# Altium footprint library custom.PcbLib: 305 footprints (part 4 of 20)
Each footprint in its own frame and in the unit in brackets; x right, y up, seen from the top. Pads: shape width x height; smd on the part's side, far side on the other; paste and mask are expansions set on the pad; w line width, h text height; cw(c..) or ccw(c..) is an arc to the next point about the centre after c.
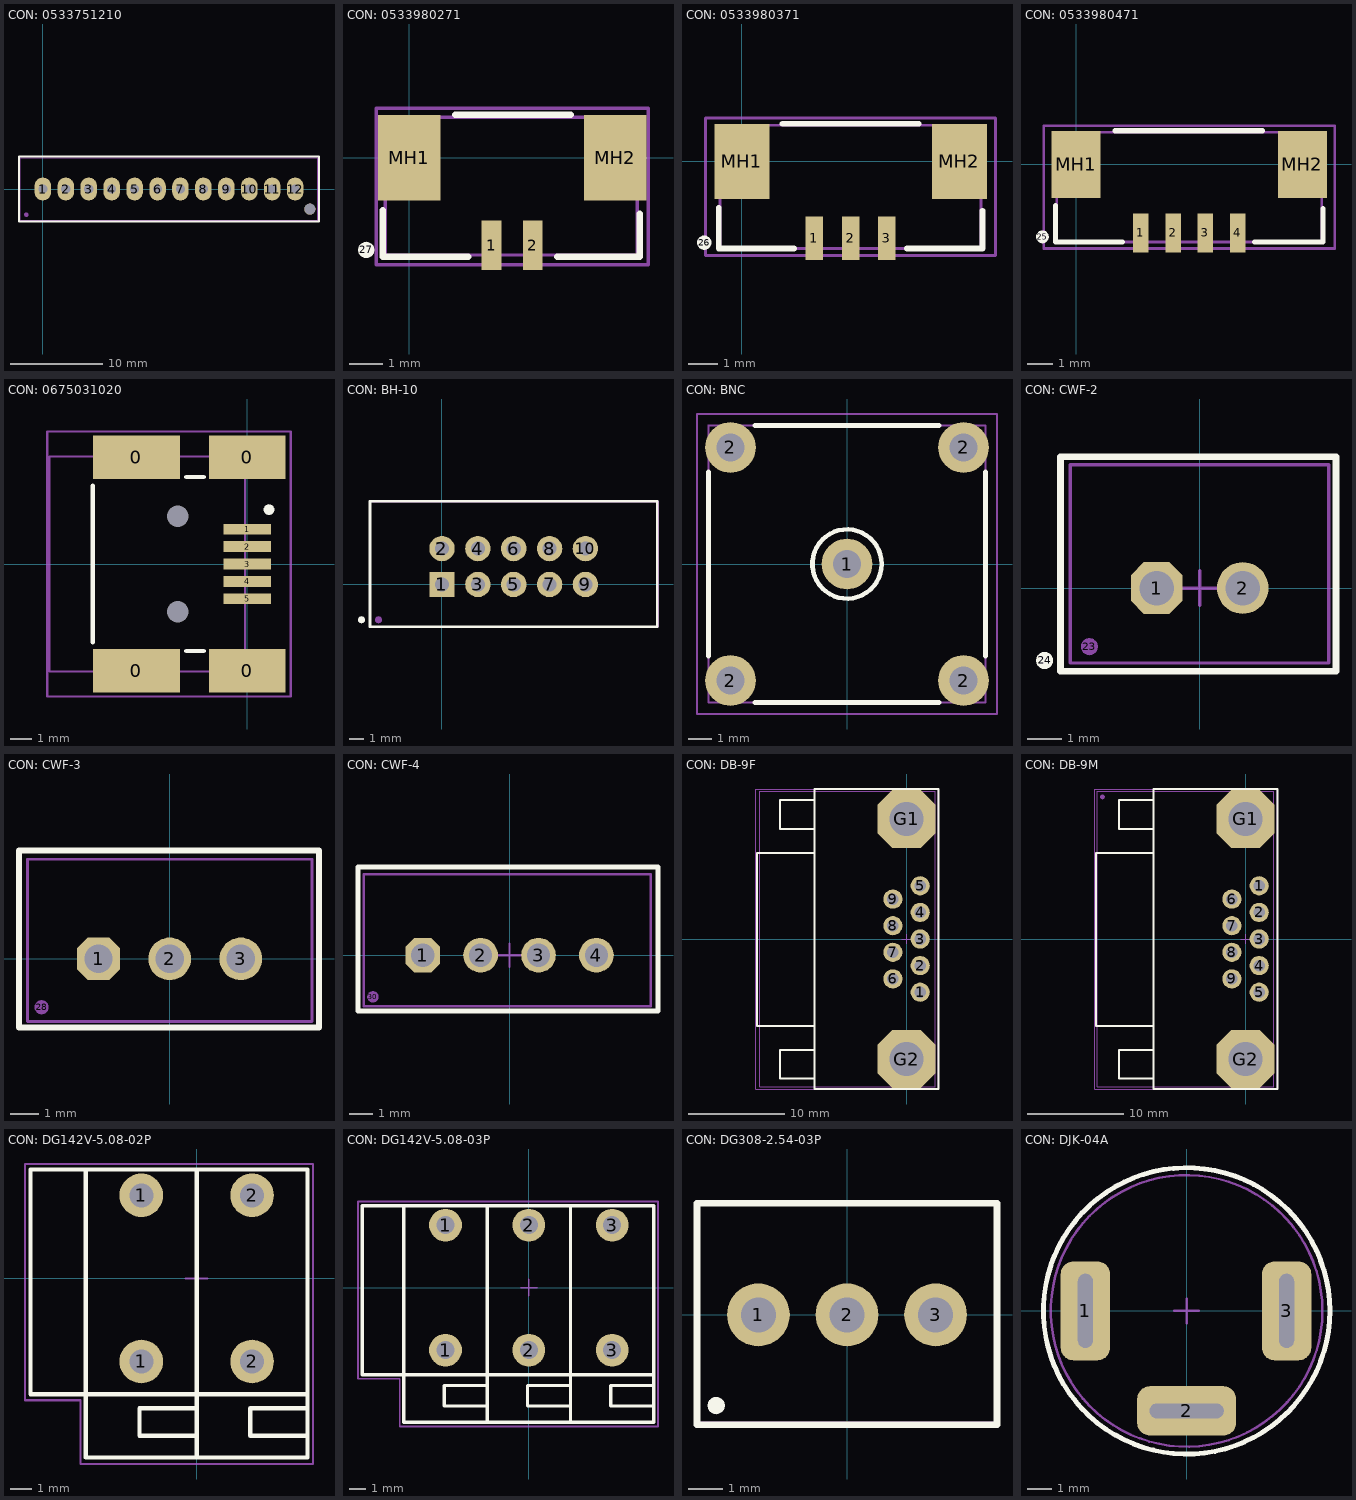
[diagram p3: the footprints below, top view; thin cyan lines are the x and y axes]

## CON: 0533751210 [mm] "MOLEX Mini-Lock"
height 11.5
pads (14):
  oval 1.8x2.5 hole 1: 1(0,0) 2(2.5,0) 3(5,0) 4(7.5,0) 5(10,0) 6(12.5,0) 7(15,0) 8(17.5,0) 9(20,0) 10(22.5,0) 11(25,0) 12(27.5,0)
  round 0.5 on Mech1: ""(-1.8,-2.8)
  round 1.2 hole 1.2: ""(29.1,-2.2)
Top Overlay:
  lines w0.254: -2.6,-3.55 30.1,-3.55 30.1,3.55 -2.6,3.55 -2.6,-3.55
Top Assy:
  lines w0.1: -2.45,-3.4 29.95,-3.4 29.95,3.4 -2.45,3.4 -2.45,-3.4
3D body "533751210.stp": height 11.55, standoff -3.38, extent -2.45,-3.4 29.95,3.4

## CON: 0533980271 [mm] "Pitch 1.25mm 2 pin Vertical SMT"
height 4.8
pads (5):
  rect 0.6x1.5 smd: 1(2.5,-2.65) 2(3.75,-2.65)
  round 0.5 on Top Overlay: 27(-1.3,-2.8)
  rect 1.9x2.6 smd: MH1(0,0) MH2(6.25,0)
Top Overlay:
  lines w0.2: -0.8,-1.6 -0.8,-3 1.8,-3 ; 1.4,1.3 4.9,1.3 ; 4.5,-3 7,-3 7,-1.7
Top Assy:
  lines w0.1: -0.725,-2.95 -0.725,-1.5 -0.725,1.225 6.925,1.225 6.925,-2.925 6.9,-2.95 -0.725,-2.95
Size Area:
  lines w0.1: -1,-3.25 -1,1.5 7.25,1.5 7.25,-3.25 -1,-3.25
3D body "533980271.stp": height 4.7, standoff 0, extent -0.725,-2.95 6.925,1.25

## CON: 0533980371 [mm] "Pitch 1.25mm 3 pin Vertical SMT"
height 4.8
pads (6):
  rect 0.6x1.5 smd: 1(2.5,-2.65) 2(3.75,-2.65) 3(5,-2.65)
  round 0.5 on Top Overlay: 26(-1.3,-2.8)
  rect 1.9x2.6 smd: MH1(0,0) MH2(7.5,0)
Top Overlay:
  lines w0.2: -0.8,-1.6 -0.8,-3 1.8,-3 ; 1.4,1.3 6.1,1.3 ; 5.7,-3 8.3,-3 8.3,-1.7
Top Assy:
  lines w0.1: -0.75,-3 -0.75,1.25 8.25,1.25 8.25,-3 -0.75,-3
Size Area:
  lines w0.1: -1.25,-3.25 -1.25,1.5 8.75,1.5 8.75,-3.25 -1.25,-3.25
3D body "533980371.stp": height 4.7, standoff 0, extent -0.7,-2.95 8.2,1.25

## CON: 0533980471 [mm]
pads (7):
  rect 0.6x1.5 smd: 1(2.5,-2.65) 2(3.75,-2.65) 3(5,-2.65) 4(6.25,-2.65)
  round 0.5 on Top Overlay: 25(-1.3,-2.8)
  rect 1.9x2.6 smd: MH1(0,0) MH2(8.75,0)
Top Overlay:
  lines w0.2: -0.8,-1.6 -0.8,-3 1.8,-3 ; 1.5,1.3 7.2,1.3 ; 6.9,-3 9.55,-3 9.55,-1.7
Top Assy:
  lines w0.1: -0.75,-3 -0.75,1.25 9.5,1.25 9.5,-3 -0.75,-3
Size Area:
  lines w0.1: -1.25,-3.25 -1.25,1.5 10,1.5 10,-3.25 -1.25,-3.25
3D body "533980471.stp": height 4.7, standoff 0, extent -0.7,-2.925 9.45,1.275

## CON: 0675031020 [mm]
pads (13):
  rect 4x2 smd: 0(-5.1,-4.9) 0(-5.1,4.9)
  rect 3.5x2 smd: 0(0,-4.9) 0(0,4.9)
  rect 2.2x0.5 smd: 1(0,1.6) 2(0,0.8) 3(0,0) 4(0,-0.8) 5(0,-1.6)
  round 0 hole 1: ""(-3.2,-2.2) ""(-3.2,2.2)
  round 0.5 on Mech1: ""(-0.6,4.5)
  round 0.5 on Top Overlay: ""(1,2.5)
Top Overlay:
  lines w0.2: -7.1,-3.6 -7.1,3.6 ; -2.8,-4 -2,-4 ; -2.8,4 -2,4
Top Assy:
  lines w0.1: -9.1,-4.95 -0.1,-4.95 -0.1,4.95 -9.1,4.95 -9.1,-4.95
Size Area:
  lines w0.1: -9.2,-6.1 2,-6.1 2,6.1 -9.2,6.1 -9.2,-6.1
3D body "675031020.stp": height 3.95, standoff -1, extent -9.1,-4.95 -0.1,4.95

## CON: BH-10 [mm] "Connector; Header; 10 Position"
pads (12):
  rect 1.8x1.8 hole 1: 1(0,0)
  round 1.8 hole 1: 2(0,2.54) 3(2.54,0) 4(2.54,2.54) 5(5.08,0) 6(5.08,2.54) 7(7.62,0) 8(7.62,2.54) 9(10.16,0) 10(10.16,2.54)
  round 0.5 on Top Overlay: ""(-5.7,-2.5)
  round 0.5 on Mech1: ""(-4.5,-2.5)
Top Overlay:
  lines w0.2: -5.1,-3 15.25,-3 15.25,5.9 -5.1,5.9 -5.1,-3
Top Assy:
  lines w0.1: -5.07,-2.98 -5.07,5.87 15.23,5.87 15.23,-2.98 -5.07,-2.98
Size Area:
  lines w0.1: -5.1,-3 15.3,-3 15.3,5.9 -5.1,5.9 -5.1,-3
3D body "User Library-IDC Socket Male 10pin Straight THT Goldplated 2_54mm.STEP": height 2.77, standoff -9.63, extent -5.07,-2.98 15.23,5.87

## CON: BNC [mm]
pads (5):
  round 2.2 hole 1.2: 1(0,0) 2(-5.05,-5.05) 2(-5.05,5.05) 2(5.05,-5.05) 2(5.05,5.05)
Top Overlay:
  circle w0.2: c0,0 r1.5
  lines w0.2: -6,-4 -6,4 ; -4,-6 4,-6 ; -4,6 4,6 ; 6,-4 6,4
Top Assy:
  circle w0.1: c0,0 r1.5
  lines w0.1: -6,6 -6,-6 6,-6 6,6 6,6 -6,6 ; -6,6 -6,6
Size Area:
  lines w0.1: -1,0 1,0 ; 0,-1 0,1 ; -6.5,-6.5 6.5,-6.5 6.5,6.5 -6.5,6.5 -6.5,-6.5
3D body "9962.stp": height 13, standoff -4.5, extent -6,-6 6,6

## CON: CWF-2 [mm]
height 7.7
pads (4):
  oct 1.5x1.5 hole 1: 1(-1.25,0)
  round 1.5 hole 1: 2(1.25,0)
  round 0.5 on Mech1: 23(-3.2,-1.7)
  round 0.5 on Top Overlay: 24(-4.5,-2.1)
Top Overlay:
  lines w0.2: -4.044,-2.413 3.957,-2.413 3.957,3.81 -4.044,3.81 -4.044,-2.413
Top Assy:
  lines w0.1: -3.75,-2.175 -3.75,3.575 3.75,3.575 3.75,-2.175 -3.75,-2.175
Size Area:
  lines w0.1: -0.5,0 0.5,0 ; 0,-0.5 0,0.5 ; -4.044,-2.413 3.957,-2.413 3.957,3.81 -4.044,3.81 -4.044,-2.413
3D body "CWF-2.step": height 7, standoff -3.5, extent -3.75,-2.175 3.75,3.575

## CON: CWF-3 [mm]
height 7.7
pads (4):
  oct 1.5x1.5 hole 1: 1(-2.5,0)
  round 1.5 hole 1: 2(0,0) 3(2.5,0)
  round 0.5 on Mech1: 28(-4.5,-1.7)
Top Overlay:
  lines w0.2: -5.294,-2.413 5.247,-2.413 5.247,3.81 -5.294,3.81 -5.294,-2.413
Top Assy:
  lines w0.1: -5,-2.2 -5,3.5 5,3.5 5,-2.2 -5,-2.2
Size Area:
  lines w0.1: -0.5,0 0.5,0 ; 0,-0.5 0,0.5 ; -5.294,-2.413 5.247,-2.413 5.247,3.81 -5.294,3.81 -5.294,-2.413
3D body "CWF-3.step": height 7, standoff -3.5, extent -5,-2.2 5,3.55

## CON: CWF-4 [mm]
height 7.7
pads (5):
  oct 1.5x1.5 hole 1: 1(-3.75,0)
  round 1.5 hole 1: 2(-1.25,0) 3(1.25,0) 4(3.75,0)
  round 0.5 on Mech1: 30(-5.9,-1.8)
Top Overlay:
  lines w0.2: -6.544,-2.413 6.41,-2.413 6.41,3.81 -6.544,3.81 -6.544,-2.413
Top Assy:
  lines w0.1: -6.3,-2.2 -6.3,3.5 6.1,3.5 6.1,-2.2 -6.3,-2.2
Size Area:
  lines w0.1: -0.5,0 0.5,0 ; 0,-0.5 0,0.5 ; -6.544,-2.413 6.41,-2.413 6.41,3.81 -6.544,3.81 -6.544,-2.413
3D body "CWF-4.step": height 7, standoff -3.5, extent -6.267,-2.194 6.133,3.556

## CON: DB-9F [mm]
height 12
pads (11):
  round 2 hole 1.2: 1(1.42,-5.54) 2(1.42,-2.77) 3(1.42,0) 4(1.42,2.77) 5(1.42,5.54) 6(-1.42,-4.155) 7(-1.42,-1.385) 8(-1.42,1.385) 9(-1.42,4.155)
  oct 6x6 hole 3.5: G1(0,12.5) G2(0,-12.5)
Top Overlay:
  lines w0.2: -9.58,-14.54 -13.185,-14.54 -13.185,-11.54 -9.58,-11.54 ; -9.58,-9.04 -15.58,-9.04 -15.58,8.96 -9.58,8.96 ; -9.58,11.46 -13.185,11.46 -13.185,14.46 -9.58,14.46 ; -9.58,-15.621 3.325,-15.621 3.325,15.621 -9.58,15.621 -9.58,-15.621
Top Assy:
  lines w0.1: -15.302,-15.405 2.998,-15.405 2.998,15.405 -15.302,15.405 -15.302,-15.405
Size Area:
  lines w0.1: -0.5,0 0.5,0 ; 0,-0.5 0,0.5 ; -15.725,-15.621 -15.725,15.621 3.325,15.621 3.325,-15.621 -15.725,-15.621
3D body "DB-9F.step": height 12.52, standoff -4.35, extent -15.302,-15.405 2.998,15.405

## CON: DB-9M [mm]
height 12
pads (12):
  round 2 hole 1.2: 1(1.42,5.54) 2(1.42,2.77) 3(1.42,0) 4(1.42,-2.77) 5(1.42,-5.54) 6(-1.42,4.155) 7(-1.42,1.385) 8(-1.42,-1.385) 9(-1.42,-4.155)
  round 0.5 on Mech1: 31(-14.9,14.8)
  oct 6x6 hole 3.5: G1(0,12.5) G2(0,-12.5)
Top Overlay:
  lines w0.2: -9.58,-14.54 -13.185,-14.54 -13.185,-11.54 -9.58,-11.54 ; -9.58,-9.04 -15.58,-9.04 -15.58,8.96 -9.58,8.96 ; -9.58,11.46 -13.185,11.46 -13.185,14.46 -9.58,14.46 ; -9.58,-15.621 -9.58,15.621 3.325,15.621 3.325,-15.621 -9.58,-15.621
Top Assy:
  lines w0.1: -15.454,-15.4 2.946,-15.4 2.946,15.4 -15.454,15.4 -15.454,-15.4
Size Area:
  lines w0.1: -0.5,0 0.5,0 ; 0,-0.5 0,0.5 ; -15.725,-15.621 3.325,-15.621 3.325,15.621 -15.725,15.621 -15.725,-15.621
3D body "DB-9M.step": height 12.52, standoff -3.9, extent -15.454,-15.4 2.946,15.4

## CON: DG142V-5.08-02P [mm]
height 14.1
pads (4):
  round 2 hole 1.1: 1(-2.54,-3.81) 1(-2.54,3.81) 2(2.54,-3.81) 2(2.54,3.81)
Top Overlay:
  lines w0.2: -5.08,4.99 -5.08,-8.21 5.08,-8.21 5.08,4.99 -7.62,4.99 -7.62,-5.31 5.08,-5.31 ; 0,-8.21 0,4.99 ; 0,-7.21 -2.62,-7.21 -2.62,-5.96 0,-5.96 ; 5.08,-7.21 2.46,-7.21 2.46,-5.96 5.08,-5.96
Top Assy:
  lines w0.1: -5.08,4.99 -5.08,-8.21 5.08,-8.21 5.08,4.99 -7.62,4.99 -7.62,-5.31 5.08,-5.31 ; 0,-8.21 0,4.99 ; 0,-7.21 -2.62,-7.21 -2.62,-5.96 0,-5.96 ; 5.08,-7.21 2.46,-7.21 2.46,-5.96 5.08,-5.96
Size Area:
  lines w0.1: -0.5,0 0.5,0 ; 0,-0.5 0,0.5 ; -7.874,-5.588 -7.874,5.244 5.334,5.244 5.334,-8.509 -2.413,-8.509 -5.334,-8.509 -5.334,-5.588 -7.874,-5.588
3D body "DG142V-5.08-02P.STEP": height 14.2, standoff 0, extent -7.62,-8.209 5.14,4.99

## CON: DG142V-5.08-03P [mm]
height 14.1
pads (6):
  round 2 hole 1.1: 1(-5.08,-3.81) 1(-5.08,3.81) 2(0,-3.81) 2(0,3.81) 3(5.08,-3.81) 3(5.08,3.81)
Top Overlay:
  lines w0.2: -7.62,4.99 -7.62,-8.21 7.62,-8.21 7.62,4.99 -10.16,4.99 -10.16,-5.31 7.62,-5.31 ; -2.54,-8.21 -2.54,4.99 ; -2.54,-7.21 -5.16,-7.21 -5.16,-5.96 -2.54,-5.96 ; 2.54,-8.21 2.54,4.99 ; 2.54,-7.21 -0.08,-7.21 -0.08,-5.96 2.54,-5.96 ; 7.62,-7.21 5,-7.21 5,-5.96 7.62,-5.96
Top Assy:
  lines w0.1: -7.62,4.99 -7.62,-8.21 7.62,-8.21 7.62,4.99 -10.16,4.99 -10.16,-5.31 7.62,-5.31 ; -2.54,-8.21 -2.54,4.99 ; -2.54,-7.21 -5.16,-7.21 -5.16,-5.96 -2.54,-5.96 ; 2.54,-8.21 2.54,4.99 ; 2.54,-7.21 -0.08,-7.21 -0.08,-5.96 2.54,-5.96 ; 7.62,-7.21 5,-7.21 5,-5.96 7.62,-5.96
Size Area:
  lines w0.1: -0.5,0 0.5,0 ; 0,-0.5 0,0.5 ; -10.414,-5.543 -7.874,-5.543 -7.874,-8.464 7.874,-8.464 7.874,5.252 -10.414,5.252 -10.414,-5.543
3D body "DG142V-5.08-03P.STEP": height 14.2, standoff 0, extent -10.16,-8.209 7.68,4.99

## CON: DG308-2.54-03P [mm]
pads (4):
  round 1.8 hole 1: 1(-2.54,0) 2(0,0) 3(2.54,0)
  round 0.5 on Top Overlay: ""(-3.75,-2.6)
Top Overlay:
  lines w0.2: -4.3,-3.15 4.3,-3.15 4.3,3.2 -4.3,3.2 -4.3,-3.15
Top Assy:
  lines w0.1: -4.26,-3.1 4.26,-3.1 4.26,3.17 -4.26,3.17 -4.26,-3.1
Size Area:
  lines w0.1: -0.5,0 0.5,0 ; 0,-0.5 0,0.5 ; -4.3,-3.15 -4.3,3.2 4.3,3.2 4.3,-3.15 -4.3,-3.15
3D body "DG308-2.54-02P.STEP": height 8.5, standoff -2, extent -4.26,-3.1 4.26,3.17

## CON: DJK-04A [mm]
height 15
pads (3):
  rrect50% 2x4 hole 0.6 slot 3 at 90 deg: 1(-4.1,0) 3(4.05,0)
  rrect50% 4x2 hole 0.6 slot 3 at 0 deg: 2(0,-4.05)
Top Overlay:
  circle w0.2: c0,0 r5.8
Top Assy:
  circle w0.1: c0,0 r5.5
Size Area:
  circle w0.1: c0,0 r5.8
  lines w0.1: -0.5,0 0.5,0 ; 0,-0.5 0,0.5
3D body "DJK-04.STEP": height 15, standoff -6, extent -5.5,-5.5 5.5,5.5